# Altium footprint library Modulos_Ftp.PcbLib: 6 footprints
Each footprint in its own frame and in the unit in brackets; x right, y up, seen from the top. Pads: shape width x height; smd on the part's side, far side on the other; paste and mask are expansions set on the pad; w line width, h text height; cw(c..) or ccw(c..) is an arc to the next point about the centre after c.
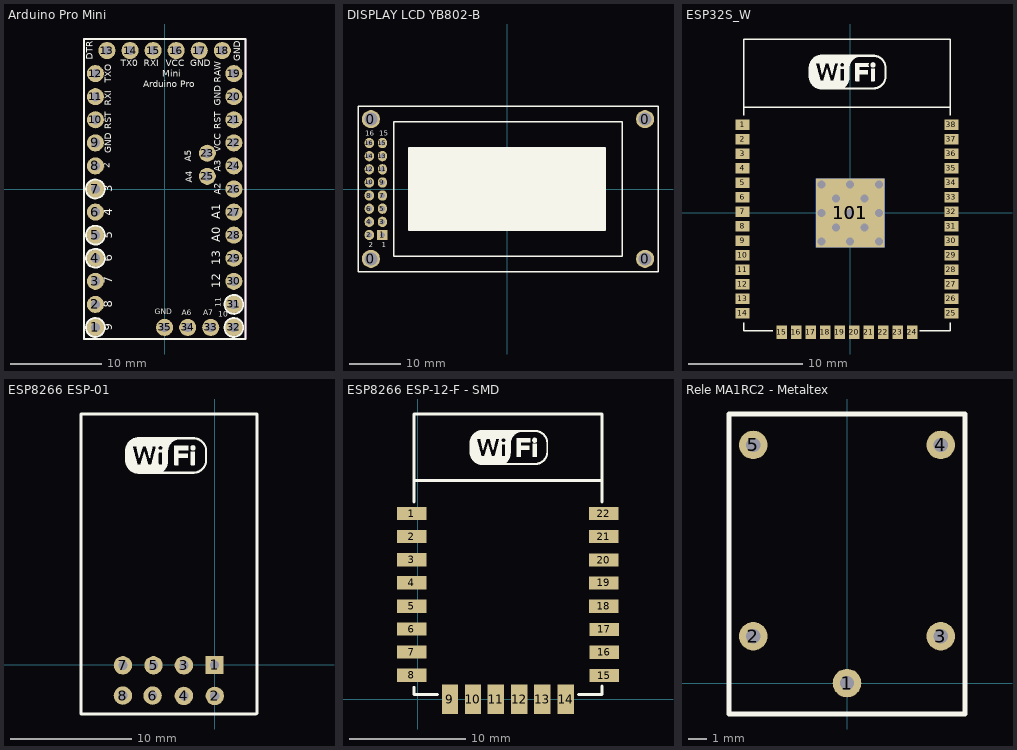
[diagram p0: the footprints below, top view; thin cyan lines are the x and y axes]

## Arduino Pro Mini [mil]
pads (35):
  round 74 hole 40: 1(-300,-600) 2(-300,-500) 3(-300,-400) 4(-300,-300) 5(-300,-200) 6(-300,-100) 7(-300,0) 8(-300,100) 9(-300,200) 10(-300,300) 11(-300,400) 12(-300,500) 13(-250,600) 14(-150,600) 15(-50,600) 16(50,600) 17(150,600) 18(250,600) 19(300,500) 20(300,400) 21(300,300) 22(300,200) 23(185,155) 24(300,100) 25(185,55) 26(300,0) 27(300,-100) 28(300,-200) 29(300,-300) 30(300,-400) 31(300,-500) 32(300,-600) 33(200,-600) 34(100,-600) 35(0,-600)
Bottom Layer:
  lines w10: 300,-409 300,-400
Top Overlay:
  circle w10: c300,-500 r40
  circle w10: c300,-600 r40
  circle w10: c-300,-600 r40
  circle w10: c-300,0 r40
  circle w10: c-300,-200 r40
  circle w10: c-300,-300 r40
  lines w8: -350,-650 350,-650 350,650 -350,650 -350,-650
  text "GND" at -43.31,-551.18 h39.37
  text "A6" at 73.93,-555.92 h39.37
  text "A7" at 167.72,-555.92 h39.37
  text "A4" at 131.33,27.9 h49.6
  text "A5" at 126.36,118.99 h49.6
  text "Mini" at -10,475 h49.6
  text "Arduino Pro" at -92,431 h49.6
  text "GND" at 338.33,553.09 h49.6
  text "DTR" at -300,560 h49.6
  text "TX0" at -190,522.05 h49.6
  text "RXI" at -90,522.05 h49.6
  text "10" at 231.67,-562.85 h39.37
  text "11" at 250.84,-512.22 h39.37
  text "12" at 255,-430 h62
  text "13" at 255,-330 h62
  text "A0" at 255,-230 h62
  text "A1" at 255,-130 h62
  text "A2" at 255,-25 h49.6
  text "A3" at 255,75 h49.6
  text "VCC" at 255,160 h49.6
  text "RST" at 255,260 h49.6
  text "GND" at 255,360 h49.6
  text "RAW" at 255,460 h49.6
  text "VCC" at 4.76,522.05 h49.6
  text "GND" at 110,522.05 h49.6
  text "TXO" at -220,460 h49.6
  text "RXI" at -220,360 h49.6
  text "RST" at -220,260 h49.6
  text "GND" at -220,155 h49.6
  text "2" at -226,90 h49.6
  text "3" at -213,-15 h62
  text "4" at -215,-115 h62
  text "5" at -215,-215 h62
  text "6" at -215,-315 h62
  text "7" at -215,-410 h62
  text "8" at -215,-515 h62
  text "9" at -215,-615 h62
Mechanical 1:
  lines w8: -350,-650 350,-650 350,650 -350,650 -350,-650
Mechanical 30:
  region: 95,-585 75,-585 75,-605 95,-605
  region: 195,-585 175,-585 175,-605 195,-605
  region: -240,610 -260,610 -260,590 -240,590
  region: -140,610 -160,610 -160,590 -140,590
  region: -40,610 -60,610 -60,590 -40,590
  region: 60,610 40,610 40,590 60,590
  region: 160,610 140,610 140,590 160,590
  region: 260,610 240,610 240,590 260,590
  region: -290,-10 -290,10 -310,10 -310,-10
  region: -290,-110 -290,-90 -310,-90 -310,-110
  region: -290,-210 -290,-190 -310,-190 -310,-210
  region: -290,-310 -290,-290 -310,-290 -310,-310
  region: -290,-410 -290,-390 -310,-390 -310,-410
  region: -290,-510 -290,-490 -310,-490 -310,-510
  region: -290,-610 -290,-590 -310,-590 -310,-610
  region: -290,90 -290,110 -310,110 -310,90
  region: -290,190 -290,210 -310,210 -310,190
  region: -290,290 -290,310 -310,310 -310,290
  region: -290,390 -290,410 -310,410 -310,390
  region: -290,490 -290,510 -310,510 -310,490
  region: 290,-90 290,-110 310,-110 310,-90
  region: 290,10 290,-10 310,-10 310,10
  region: 290,110 290,90 310,90 310,110
  region: 290,210 290,190 310,190 310,210
  region: 290,310 290,290 310,290 310,310
  region: 290,410 290,390 310,390 310,410
  region: 290,510 290,490 310,490 310,510
  region: 290,-190 290,-210 310,-210 310,-190
  region: 290,-290 290,-310 310,-310 310,-290
  region: 290,-390 290,-410 310,-410 310,-390
  region: 290,-490 290,-510 310,-510 310,-490
  region: 290,-590 290,-610 310,-610 310,-590
  region: 195,145 195,165 175,165 175,145
  region: 195,45 195,65 175,65 175,45
3D body: height 476.38, standoff -255.91, extent -365,-669.29 367.28,669.29

## DISPLAY LCD YB802-B [mm]
pads (20):
  round 3.5 hole 2.5: 0(-26.34,-13.5) 0(-26.34,13.5) 0(26.66,-13.5) 0(26.66,13.5)
  rect 2x2 hole 1: 1(-24.12,-8.89)
  oval 1.8x2 hole 1: 2(-26.66,-8.89) 3(-24.12,-6.35) 4(-26.66,-6.35) 5(-24.12,-3.81) 6(-26.66,-3.81) 7(-24.12,-1.27) 8(-26.66,-1.27) 9(-24.12,1.27) 10(-26.66,1.27) 11(-24.12,3.81) 12(-26.66,3.81) 13(-24.12,6.35) 14(-26.66,6.35) 15(-24.12,8.89) 16(-26.66,8.89)
Top Overlay:
  rectangle: -19,-8 19,8
  lines w0.254: -28.84,-16 29.16,-16 29.16,16 -28.84,16 -28.84,-16 ; -21.94,-13 -21.94,13 22.26,13 22.26,-13 -21.94,-13 ; -19,-8 19,-8 19,8 -19,8 -19,-8
  text "16" at -27.422,10.287 h1
  text "15" at -24.755,10.287 h1
  text "2" at -26.787,-11.303 h1
  text "1" at -24.247,-11.303 h1
3D body: height 11.6, standoff -1.4, extent -28.873,-15.871 29.127,16.129

## ESP32S_W [mm] "Esp32S Module wide for hand soldering"
pads (53):
  rect 1.2x0.9 smd: 1(-9.427,7.734) 2(-9.427,6.464) 3(-9.427,5.194) 4(-9.427,3.924) 5(-9.427,2.654) 6(-9.427,1.384) 7(-9.427,0.114) 8(-9.427,-1.156) 9(-9.427,-2.426) 10(-9.427,-3.696) 11(-9.427,-4.966) 12(-9.427,-6.236) 13(-9.427,-7.506) 14(-9.427,-8.776) 25(8.861,-8.776) 26(8.861,-7.506) 27(8.861,-6.236) 28(8.861,-4.966) 29(8.861,-3.696) 30(8.861,-2.426) 31(8.861,-1.156) 32(8.861,0.114) 33(8.861,1.384) 34(8.861,2.654) 35(8.861,3.924) 36(8.861,5.194) 37(8.861,6.464) 38(8.861,7.734)
  rect 0.9x1.2 smd: 15(-5.998,-10.427) 16(-4.73,-10.427) 17(-3.46,-10.427) 18(-2.19,-10.427) 19(-0.92,-10.427) 20(0.35,-10.427) 21(1.62,-10.427) 22(2.89,-10.427) 23(4.16,-10.427) 24(5.43,-10.427)
  round 0.9 hole 0.7: 101(-2.5,-2.5) 101(-2.5,0) 101(-2.5,2.5) 101(-1.25,-1.25) 101(-1.25,1.25) 101(0,-2.5) 101(0,0) 101(0,2.5) 101(1.25,-1.25) 101(1.25,1.25) 101(2.5,-2.5) 101(2.5,0) 101(2.5,2.5)
  rect 6x6 smd: 101(0,0)
  rect 6x6 smd far side: 101(0,0)
Top Overlay:
  drawing of 1184 lines, arcs and shapes, not listed
3D body: height 2.91, standoff -0.01, extent -9.283,-10.35 8.717,15.15

## ESP8266 ESP-01 [mil]
pads (8):
  rect 60x60 hole 30: 1(0,0)
  round 60 hole 30: 2(1,-101) 3(-100,-1) 4(-100,-101) 5(-199,-1) 6(-202,-100) 7(-299,-1) 8(-299,-100)
Top Overlay:
  drawing of 1181 lines, arcs and shapes, not listed
  text ".Designator" at -451,-198 h39.37
3D body: height 3.94, standoff -455.8, extent -436,-156 134.87,820.38

## ESP8266 ESP-12-F - SMD [mil] "ESP8266 ESP-12-E"
pads (22):
  rect 100x45 smd: 1(-20,632) 2(-20,554) 3(-20,475) 4(-20,397) 5(-20,317) 6(-20,239) 7(-20,161) 8(-20,82) 15(635,81) 16(635,160) 17(635,238) 18(634,317) 19(634,396) 20(634,474) 21(634,554) 22(634,632)
  rect 55x100 smd: 9(110,0) 10(188,0) 11(266,0) 12(346,0) 13(424,0) 14(504,0)
Top Overlay:
  drawing of 1184 lines, arcs and shapes, not listed
  text ".Designator" at -26,-98 h39.37
3D body: height 117.72, standoff -0.39, extent -4.97,20.09 624.95,979.93

## Rele MA1RC2 - Metaltex [mil]
pads (5):
  round 60 hole 30: 1(0,0) 2(-196.85,98.43) 3(196.85,98.43) 4(196.85,500) 5(-196.85,500)
Top Overlay:
  lines w10: -248.03,-64.96 -248.03,564.96 248.03,564.96 248.03,-64.96 -248.03,-64.96